# Altium schematic symbol library WR-TBL_Pluggable PCB Header.SchLib: 719 symbols (part 1 of 5)
Pins are listed as number, name and electrical type; pins without a type are passive.

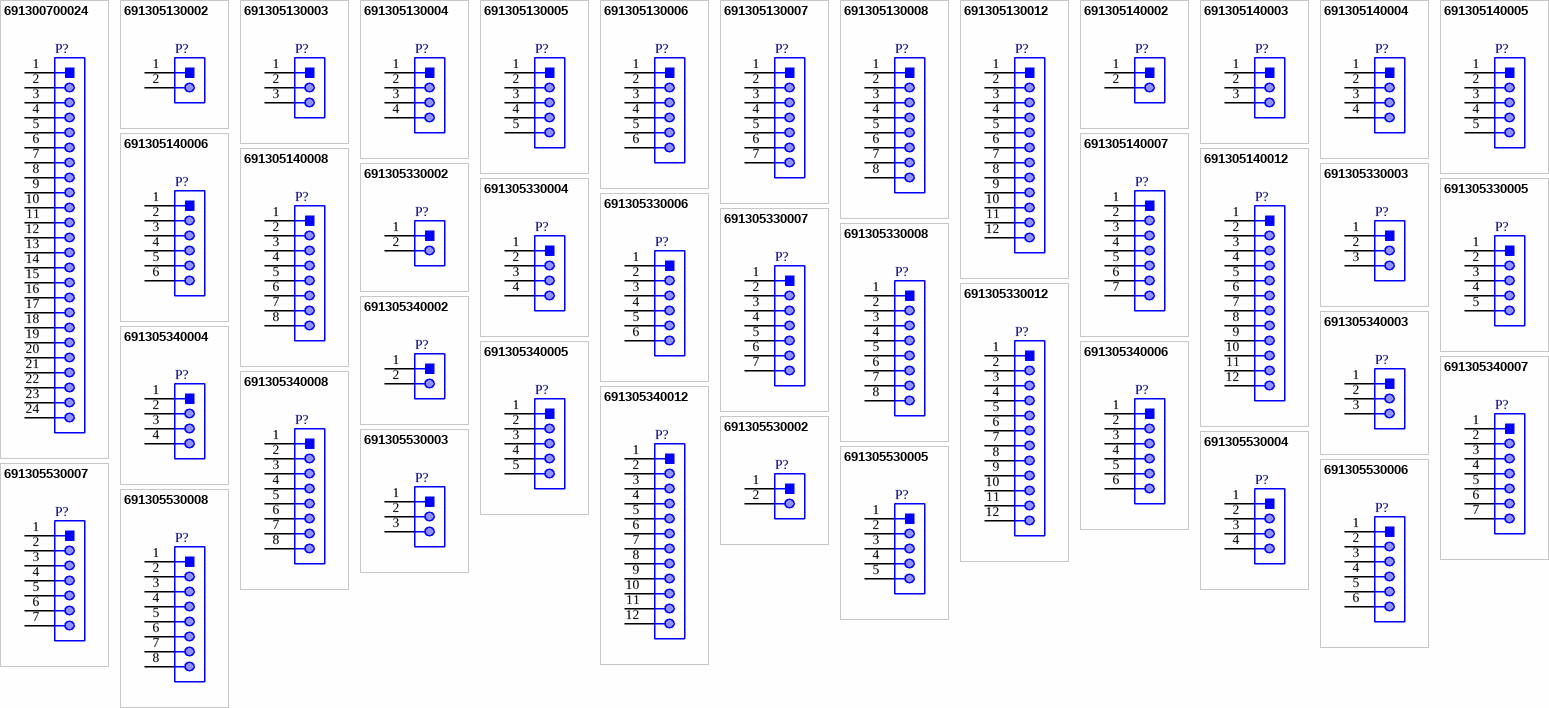
[diagram p0: symbols 691300700024 to 691305530008]

## 691300700024
designator P?
WR-TBL Serie 300 Vertical Pin Header, Pluggable, pitch 5mm, 24p; Part Number: 691300700024; Compliance: RoHS; Modularity: Yes; PCB/Cable/Panel: PCB; Pin Number: 24; Rated Current [UL]: 15A; Working Voltage [UL]: 300VAC; ComponentLink1Description: Manufacturer; ComponentLink1URL: http://www.we-online.de; ComponentLink2URL: https://katalog.we-online.de/em/datasheet/691300700024.pdf; ComponentLink2Description: Datasheet; Mounting Technology: THT; Packaging: Box; Operating Temperature: -40 to +105degC; Pitch: 5mm; Published Date: October 2019; Type: Vertical; Publisher: Wurth Elektronik; Application: Pluggable
footprint 691300700024
pins: 1, 2, 3, 4, 5, 6, 7, 8, 9, 10, 11, 12, 13, 14, 15, 16, 17, 18, 19, 20, 21, 22, 23, 24

## 691305130002
designator P?
WR-TBL Serie 3051 Vertical PCB Header, Pluggable, pitch 3.5mm, 2p; Part Number: 691305130002; Compliance: Lead free / RoHS; Modularity: No; Pin Number: 2; Rated Current [UL]: 12A; Working Voltage [UL]: 300VAC; ComponentLink1Description: Manufacturer; ComponentLink1URL: http://www.we-online.de; ComponentLink2URL: https://katalog.we-online.de/em/datasheet/691305130002.pdf; ComponentLink2Description: Datasheet; Mounting Technology: THT; Packaging: Box; Operating Temperature: -40 to +105degC; PCB/Cable/Panel: PCB; Pitch: 3.5mm; Published Date: October 2019; Type: Vertical; Publisher: Wurth Elektronik; Application: Pluggable
footprint 691305130002
pins: 1, 2

## 691305130003
designator P?
WR-TBL Serie 3051 Vertical PCB Header, Pluggable, pitch 3.5mm, 3p; Part Number: 691305130003; Compliance: Lead free / RoHS; Modularity: No; Pin Number: 3; Rated Current [UL]: 12A; Working Voltage [UL]: 300VAC; ComponentLink1Description: Manufacturer; ComponentLink1URL: http://www.we-online.de; ComponentLink2URL: https://katalog.we-online.de/em/datasheet/691305130003.pdf; ComponentLink2Description: Datasheet; Mounting Technology: THT; Packaging: Box; Operating Temperature: -40 to +105degC; PCB/Cable/Panel: PCB; Pitch: 3.5mm; Published Date: October 2019; Type: Vertical; Publisher: Wurth Elektronik; Application: Pluggable
footprint 691305130003
pins: 1, 2, 3

## 691305130004
designator P?
WR-TBL Serie 3051 Vertical PCB Header, Pluggable, pitch 3.5mm, 4p; Part Number: 691305130004; Compliance: Lead free / RoHS; Modularity: No; Pin Number: 4; Rated Current [UL]: 12A; Working Voltage [UL]: 300VAC; ComponentLink1Description: Manufacturer; ComponentLink1URL: http://www.we-online.de; ComponentLink2URL: https://katalog.we-online.de/em/datasheet/691305130004.pdf; ComponentLink2Description: Datasheet; Mounting Technology: THT; Packaging: Box; Operating Temperature: -40 to +105degC; PCB/Cable/Panel: PCB; Pitch: 3.5mm; Published Date: October 2019; Type: Vertical; Publisher: Wurth Elektronik; Application: Pluggable
footprint 691305130004
pins: 1, 2, 3, 4

## 691305130005
designator P?
WR-TBL Serie 3051 Vertical PCB Header, Pluggable, pitch 3.5mm, 5p; Part Number: 691305130005; Compliance: Lead free / RoHS; Modularity: No; Pin Number: 5; Rated Current [UL]: 12A; Working Voltage [UL]: 300VAC; ComponentLink1Description: Manufacturer; ComponentLink1URL: http://www.we-online.de; ComponentLink2URL: https://katalog.we-online.de/em/datasheet/691305130005.pdf; ComponentLink2Description: Datasheet; Mounting Technology: THT; Packaging: Box; Operating Temperature: -40 to +105degC; PCB/Cable/Panel: PCB; Pitch: 3.5mm; Published Date: October 2019; Type: Vertical; Publisher: Wurth Elektronik; Application: Pluggable
footprint 691305130005
pins: 1, 2, 3, 4, 5

## 691305130006
designator P?
WR-TBL Serie 3051 Vertical PCB Header, Pluggable, pitch 3.5mm, 6p; Part Number: 691305130006; Compliance: Lead free / RoHS; Modularity: No; Pin Number: 6; Rated Current [UL]: 12A; Working Voltage [UL]: 300VAC; ComponentLink1Description: Manufacturer; ComponentLink1URL: http://www.we-online.de; ComponentLink2URL: https://katalog.we-online.de/em/datasheet/691305130006.pdf; ComponentLink2Description: Datasheet; Mounting Technology: THT; Packaging: Box; Operating Temperature: -40 to +105degC; PCB/Cable/Panel: PCB; Pitch: 3.5mm; Published Date: October 2019; Type: Vertical; Publisher: Wurth Elektronik; Application: Pluggable
footprint 691305130006
pins: 1, 2, 3, 4, 5, 6

## 691305130007
designator P?
WR-TBL Serie 3051 Vertical PCB Header, Pluggable, pitch 3.5mm, 7p; Part Number: 691305130007; Compliance: Lead free / RoHS; Modularity: No; Pin Number: 7; Rated Current [UL]: 12A; Working Voltage [UL]: 300VAC; ComponentLink1Description: Manufacturer; ComponentLink1URL: http://www.we-online.de; ComponentLink2URL: https://katalog.we-online.de/em/datasheet/691305130007.pdf; ComponentLink2Description: Datasheet; Mounting Technology: THT; Packaging: Box; Operating Temperature: -40 to +105degC; PCB/Cable/Panel: PCB; Pitch: 3.5mm; Published Date: October 2019; Type: Vertical; Publisher: Wurth Elektronik; Application: Pluggable
footprint 691305130007
pins: 1, 2, 3, 4, 5, 6, 7

## 691305130008
designator P?
WR-TBL Serie 3051 Vertical PCB Header, Pluggable, pitch 3.5mm, 8p; Part Number: 691305130008; Compliance: Lead free / RoHS; Modularity: No; Pin Number: 8; Rated Current [UL]: 12A; Working Voltage [UL]: 300VAC; ComponentLink1Description: Manufacturer; ComponentLink1URL: http://www.we-online.de; ComponentLink2URL: https://katalog.we-online.de/em/datasheet/691305130008.pdf; ComponentLink2Description: Datasheet; Mounting Technology: THT; Packaging: Box; Operating Temperature: -40 to +105degC; PCB/Cable/Panel: PCB; Pitch: 3.5mm; Published Date: October 2019; Type: Vertical; Publisher: Wurth Elektronik; Application: Pluggable
footprint 691305130008
pins: 1, 2, 3, 4, 5, 6, 7, 8

## 691305130012
designator P?
WR-TBL Serie 3051 Vertical PCB Header, Pluggable, pitch 3.5mm, 12p; Part Number: 691305130012; Compliance: Lead free / RoHS; Modularity: No; Pin Number: 12; Rated Current [UL]: 12A; Working Voltage [UL]: 300VAC; ComponentLink1Description: Manufacturer; ComponentLink1URL: http://www.we-online.de; ComponentLink2URL: https://katalog.we-online.de/em/datasheet/691305130012.pdf; ComponentLink2Description: Datasheet; Mounting Technology: THT; Packaging: Box; Operating Temperature: -40 to +105degC; PCB/Cable/Panel: PCB; Pitch: 3.5mm; Published Date: October 2019; Type: Vertical; Publisher: Wurth Elektronik; Application: Pluggable
footprint 691305130012
pins: 1, 2, 3, 4, 5, 6, 7, 8, 9, 10, 11, 12

## 691305140002
designator P?
WR-TBL Serie 3051 Horizontal PCB Header, Pluggable, pitch 3.5mm, 2p; Part Number: 691305140002; Compliance: Lead free / RoHS; Modularity: No; Pin Number: 2; Rated Current [UL]: 12A; Working Voltage [UL]: 300VAC; ComponentLink1Description: Manufacturer; ComponentLink1URL: http://www.we-online.de; ComponentLink2URL: https://katalog.we-online.de/em/datasheet/691305140002.pdf; ComponentLink2Description: Datasheet; Mounting Technology: THT; Packaging: Box; Operating Temperature: -40 to +105degC; PCB/Cable/Panel: PCB; Pitch: 3.5mm; Published Date: October 2019; Type: Horizontal; Publisher: Wurth Elektronik; Application: Pluggable
footprint 691305140002
pins: 1, 2

## 691305140003
designator P?
WR-TBL Serie 3051 Horizontal PCB Header, Pluggable, pitch 3.5mm, 3p; Part Number: 691305140003; Compliance: Lead free / RoHS; Modularity: No; Pin Number: 3; Rated Current [UL]: 12A; Working Voltage [UL]: 300VAC; ComponentLink1Description: Manufacturer; ComponentLink1URL: http://www.we-online.de; ComponentLink2URL: https://katalog.we-online.de/em/datasheet/691305140003.pdf; ComponentLink2Description: Datasheet; Mounting Technology: THT; Packaging: Box; Operating Temperature: -40 to +105degC; PCB/Cable/Panel: PCB; Pitch: 3.5mm; Published Date: October 2019; Type: Horizontal; Publisher: Wurth Elektronik; Application: Pluggable
footprint 691305140003
pins: 1, 2, 3

## 691305140004
designator P?
WR-TBL Serie 3051 Horizontal PCB Header, Pluggable, pitch 3.5mm, 4p; Part Number: 691305140004; Compliance: Lead free / RoHS; Modularity: No; Pin Number: 4; Rated Current [UL]: 12A; Working Voltage [UL]: 300VAC; ComponentLink1Description: Manufacturer; ComponentLink1URL: http://www.we-online.de; ComponentLink2URL: https://katalog.we-online.de/em/datasheet/691305140004.pdf; ComponentLink2Description: Datasheet; Mounting Technology: THT; Packaging: Box; Operating Temperature: -40 to +105degC; PCB/Cable/Panel: PCB; Pitch: 3.5mm; Published Date: October 2019; Type: Horizontal; Publisher: Wurth Elektronik; Application: Pluggable
footprint 691305140004
pins: 1, 2, 3, 4

## 691305140005
designator P?
WR-TBL Serie 3051 Horizontal PCB Header, Pluggable, pitch 3.5mm, 5p; Part Number: 691305140005; Compliance: Lead free / RoHS; Modularity: No; Pin Number: 5; Rated Current [UL]: 12A; Working Voltage [UL]: 300VAC; ComponentLink1Description: Manufacturer; ComponentLink1URL: http://www.we-online.de; ComponentLink2URL: https://katalog.we-online.de/em/datasheet/691305140005.pdf; ComponentLink2Description: Datasheet; Mounting Technology: THT; Packaging: Box; Operating Temperature: -40 to +105degC; PCB/Cable/Panel: PCB; Pitch: 3.5mm; Published Date: October 2019; Type: Horizontal; Publisher: Wurth Elektronik; Application: Pluggable
footprint 691305140005
pins: 1, 2, 3, 4, 5

## 691305140006
designator P?
WR-TBL Serie 3051 Horizontal PCB Header, Pluggable, pitch 3.5mm, 6p; Part Number: 691305140006; Compliance: Lead free / RoHS; Modularity: No; Pin Number: 6; Rated Current [UL]: 12A; Working Voltage [UL]: 300VAC; ComponentLink1Description: Manufacturer; ComponentLink1URL: http://www.we-online.de; ComponentLink2URL: https://katalog.we-online.de/em/datasheet/691305140006.pdf; ComponentLink2Description: Datasheet; Mounting Technology: THT; Packaging: Box; Operating Temperature: -40 to +105degC; PCB/Cable/Panel: PCB; Pitch: 3.5mm; Published Date: October 2019; Type: Horizontal; Publisher: Wurth Elektronik; Application: Pluggable
footprint 691305140006
pins: 1, 2, 3, 4, 5, 6

## 691305140007
designator P?
WR-TBL Serie 3051 Horizontal PCB Header, Pluggable, pitch 3.5mm, 7p; Part Number: 691305140007; Compliance: Lead free / RoHS; Modularity: No; Pin Number: 7; Rated Current [UL]: 12A; Working Voltage [UL]: 300VAC; ComponentLink1Description: Manufacturer; ComponentLink1URL: http://www.we-online.de; ComponentLink2URL: https://katalog.we-online.de/em/datasheet/691305140007.pdf; ComponentLink2Description: Datasheet; Mounting Technology: THT; Packaging: Box; Operating Temperature: -40 to +105degC; PCB/Cable/Panel: PCB; Pitch: 3.5mm; Published Date: October 2019; Type: Horizontal; Publisher: Wurth Elektronik; Application: Pluggable
footprint 691305140007
pins: 1, 2, 3, 4, 5, 6, 7

## 691305140008
designator P?
WR-TBL Serie 3051 Horizontal PCB Header, Pluggable, pitch 3.5mm, 8p; Part Number: 691305140008; Compliance: Lead free / RoHS; Modularity: No; Pin Number: 8; Rated Current [UL]: 12A; Working Voltage [UL]: 300VAC; ComponentLink1Description: Manufacturer; ComponentLink1URL: http://www.we-online.de; ComponentLink2URL: https://katalog.we-online.de/em/datasheet/691305140008.pdf; ComponentLink2Description: Datasheet; Mounting Technology: THT; Packaging: Box; Operating Temperature: -40 to +105degC; PCB/Cable/Panel: PCB; Pitch: 3.5mm; Published Date: October 2019; Type: Horizontal; Publisher: Wurth Elektronik; Application: Pluggable
footprint 691305140008
pins: 1, 2, 3, 4, 5, 6, 7, 8

## 691305140012
designator P?
WR-TBL Serie 3051 Horizontal PCB Header, Pluggable, pitch 3.5mm, 12p; Part Number: 691305140012; Compliance: Lead free / RoHS; Modularity: No; Pin Number: 12; Rated Current [UL]: 12A; Working Voltage [UL]: 300VAC; ComponentLink1Description: Manufacturer; ComponentLink1URL: http://www.we-online.de; ComponentLink2URL: https://katalog.we-online.de/em/datasheet/691305140012.pdf; ComponentLink2Description: Datasheet; Mounting Technology: THT; Packaging: Box; Operating Temperature: -40 to +105degC; PCB/Cable/Panel: PCB; Pitch: 3.5mm; Published Date: October 2019; Type: Horizontal; Publisher: Wurth Elektronik; Application: Pluggable
footprint 691305140012
pins: 1, 2, 3, 4, 5, 6, 7, 8, 9, 10, 11, 12

## 691305330002
designator P?
WR-TBL Serie 3053 Vertical PCB Header, Pluggable, pitch 3.81mm, 2p; Part Number: 691305330002; Compliance: Lead free / RoHS; Modularity: No; Pin Number: 2; Rated Current [UL]: 12A; Working Voltage [UL]: 300VAC; ComponentLink1Description: Manufacturer; ComponentLink1URL: http://www.we-online.de; ComponentLink2URL: https://katalog.we-online.de/em/datasheet/691305330002.pdf; ComponentLink2Description: Datasheet; Mounting Technology: THT; Packaging: Box; Operating Temperature: -40 to +105degC; PCB/Cable/Panel: PCB; Pitch: 3.81mm; Published Date: October 2019; Type: Vertical; Publisher: Wurth Elektronik; Application: Pluggable
footprint 691305330002
pins: 1, 2

## 691305330003
designator P?
WR-TBL Serie 3053 Vertical PCB Header, Pluggable, pitch 3.81mm, 3p; Part Number: 691305330003; Compliance: Lead free / RoHS; Modularity: No; Pin Number: 3; Rated Current [UL]: 12A; Working Voltage [UL]: 300VAC; ComponentLink1Description: Manufacturer; ComponentLink1URL: http://www.we-online.de; ComponentLink2URL: https://katalog.we-online.de/em/datasheet/691305330003.pdf; ComponentLink2Description: Datasheet; Mounting Technology: THT; Packaging: Box; Operating Temperature: -40 to +105degC; PCB/Cable/Panel: PCB; Pitch: 3.81mm; Published Date: October 2019; Type: Vertical; Publisher: Wurth Elektronik; Application: Pluggable
footprint 691305330003
pins: 1, 2, 3

## 691305330004
designator P?
WR-TBL Serie 3053 Vertical PCB Header, Pluggable, pitch 3.81mm, 4p; Part Number: 691305330004; Compliance: Lead free / RoHS; Modularity: No; Pin Number: 4; Rated Current [UL]: 12A; Working Voltage [UL]: 300VAC; ComponentLink1Description: Manufacturer; ComponentLink1URL: http://www.we-online.de; ComponentLink2URL: https://katalog.we-online.de/em/datasheet/691305330004.pdf; ComponentLink2Description: Datasheet; Mounting Technology: THT; Packaging: Box; Operating Temperature: -40 to +105degC; PCB/Cable/Panel: PCB; Pitch: 3.81mm; Published Date: October 2019; Type: Vertical; Publisher: Wurth Elektronik; Application: Pluggable
footprint 691305330004
pins: 1, 2, 3, 4

## 691305330005
designator P?
WR-TBL Serie 3053 Vertical PCB Header, Pluggable, pitch 3.81mm, 5p; Part Number: 691305330005; Compliance: Lead free / RoHS; Modularity: No; Pin Number: 5; Rated Current [UL]: 12A; Working Voltage [UL]: 300VAC; ComponentLink1Description: Manufacturer; ComponentLink1URL: http://www.we-online.de; ComponentLink2URL: https://katalog.we-online.de/em/datasheet/691305330005.pdf; ComponentLink2Description: Datasheet; Mounting Technology: THT; Packaging: Box; Operating Temperature: -40 to +105degC; PCB/Cable/Panel: PCB; Pitch: 3.81mm; Published Date: October 2019; Type: Vertical; Publisher: Wurth Elektronik; Application: Pluggable
footprint 691305330005
pins: 1, 2, 3, 4, 5

## 691305330006
designator P?
WR-TBL Serie 3053 Vertical PCB Header, Pluggable, pitch 3.81mm, 6p; Part Number: 691305330006; Compliance: Lead free / RoHS; Modularity: No; Pin Number: 6; Rated Current [UL]: 12A; Working Voltage [UL]: 300VAC; ComponentLink1Description: Manufacturer; ComponentLink1URL: http://www.we-online.de; ComponentLink2URL: https://katalog.we-online.de/em/datasheet/691305330006.pdf; ComponentLink2Description: Datasheet; Mounting Technology: THT; Packaging: Box; Operating Temperature: -40 to +105degC; PCB/Cable/Panel: PCB; Pitch: 3.81mm; Published Date: October 2019; Type: Vertical; Publisher: Wurth Elektronik; Application: Pluggable
footprint 691305330006
pins: 1, 2, 3, 4, 5, 6

## 691305330007
designator P?
WR-TBL Serie 3053 Vertical PCB Header, Pluggable, pitch 3.81mm, 7p; Part Number: 691305330007; Compliance: Lead free / RoHS; Modularity: No; Pin Number: 7; Rated Current [UL]: 12A; Working Voltage [UL]: 300VAC; ComponentLink1Description: Manufacturer; ComponentLink1URL: http://www.we-online.de; ComponentLink2URL: https://katalog.we-online.de/em/datasheet/691305330007.pdf; ComponentLink2Description: Datasheet; Mounting Technology: THT; Packaging: Box; Operating Temperature: -40 to +105degC; PCB/Cable/Panel: PCB; Pitch: 3.81mm; Published Date: October 2019; Type: Vertical; Publisher: Wurth Elektronik; Application: Pluggable
footprint 691305330007
pins: 1, 2, 3, 4, 5, 6, 7

## 691305330008
designator P?
WR-TBL Serie 3053 Vertical PCB Header, Pluggable, pitch 3.81mm, 8p; Part Number: 691305330008; Compliance: Lead free / RoHS; Modularity: No; Pin Number: 8; Rated Current [UL]: 12A; Working Voltage [UL]: 300VAC; ComponentLink1Description: Manufacturer; ComponentLink1URL: http://www.we-online.de; ComponentLink2URL: https://katalog.we-online.de/em/datasheet/691305330008.pdf; ComponentLink2Description: Datasheet; Mounting Technology: THT; Packaging: Box; Operating Temperature: -40 to +105degC; PCB/Cable/Panel: PCB; Pitch: 3.81mm; Published Date: October 2019; Type: Vertical; Publisher: Wurth Elektronik; Application: Pluggable
footprint 691305330008
pins: 1, 2, 3, 4, 5, 6, 7, 8

## 691305330012
designator P?
WR-TBL Serie 3053 Vertical PCB Header, Pluggable, pitch 3.81mm, 12p; Part Number: 691305330012; Compliance: Lead free / RoHS; Modularity: No; Pin Number: 12; Rated Current [UL]: 12A; Working Voltage [UL]: 300VAC; ComponentLink1Description: Manufacturer; ComponentLink1URL: http://www.we-online.de; ComponentLink2URL: https://katalog.we-online.de/em/datasheet/691305330012.pdf; ComponentLink2Description: Datasheet; Mounting Technology: THT; Packaging: Box; Operating Temperature: -40 to +105degC; PCB/Cable/Panel: PCB; Pitch: 3.81mm; Published Date: October 2019; Type: Vertical; Publisher: Wurth Elektronik; Application: Pluggable
footprint 691305330012
pins: 1, 2, 3, 4, 5, 6, 7, 8, 9, 10, 11, 12

## 691305340002
designator P?
WR-TBL Serie 3053 Horizontal PCB Header, Pluggable, pitch 3.81mm, 2p; Part Number: 691305340002; Compliance: Lead free / RoHS; Modularity: No; Pin Number: 2; Rated Current [UL]: 12A; Working Voltage [UL]: 300VAC; ComponentLink1Description: Manufacturer; ComponentLink1URL: http://www.we-online.de; ComponentLink2URL: https://katalog.we-online.de/em/datasheet/691305340002.pdf; ComponentLink2Description: Datasheet; Mounting Technology: THT; Packaging: Box; Operating Temperature: -40 to +105degC; PCB/Cable/Panel: PCB; Pitch: 3.81mm; Published Date: October 2019; Type: Horizontal; Publisher: Wurth Elektronik; Application: Pluggable
footprint 691305340002
pins: 1, 2

## 691305340003
designator P?
WR-TBL Serie 3053 Horizontal PCB Header, Pluggable, pitch 3.81mm, 3p; Part Number: 691305340003; Compliance: Lead free / RoHS; Modularity: No; Pin Number: 3; Rated Current [UL]: 12A; Working Voltage [UL]: 300VAC; ComponentLink1Description: Manufacturer; ComponentLink1URL: http://www.we-online.de; ComponentLink2URL: https://katalog.we-online.de/em/datasheet/691305340003.pdf; ComponentLink2Description: Datasheet; Mounting Technology: THT; Packaging: Box; Operating Temperature: -40 to +105degC; PCB/Cable/Panel: PCB; Pitch: 3.81mm; Published Date: October 2019; Type: Horizontal; Publisher: Wurth Elektronik; Application: Pluggable
footprint 691305340003
pins: 1, 2, 3

## 691305340004
designator P?
WR-TBL Serie 3053 Horizontal PCB Header, Pluggable, pitch 3.81mm, 4p; Part Number: 691305340004; Compliance: Lead free / RoHS; Modularity: No; Pin Number: 4; Rated Current [UL]: 12A; Working Voltage [UL]: 300VAC; ComponentLink1Description: Manufacturer; ComponentLink1URL: http://www.we-online.de; ComponentLink2URL: https://katalog.we-online.de/em/datasheet/691305340004.pdf; ComponentLink2Description: Datasheet; Mounting Technology: THT; Packaging: Box; Operating Temperature: -40 to +105degC; PCB/Cable/Panel: PCB; Pitch: 3.81mm; Published Date: October 2019; Type: Horizontal; Publisher: Wurth Elektronik; Application: Pluggable
footprint 691305340004
pins: 1, 2, 3, 4

## 691305340005
designator P?
WR-TBL Serie 3053 Horizontal PCB Header, Pluggable, pitch 3.81mm, 5p; Part Number: 691305340005; Compliance: Lead free / RoHS; Modularity: No; Pin Number: 5; Rated Current [UL]: 12A; Working Voltage [UL]: 300VAC; ComponentLink1Description: Manufacturer; ComponentLink1URL: http://www.we-online.de; ComponentLink2URL: https://katalog.we-online.de/em/datasheet/691305340005.pdf; ComponentLink2Description: Datasheet; Mounting Technology: THT; Packaging: Box; Operating Temperature: -40 to +105degC; PCB/Cable/Panel: PCB; Pitch: 3.81mm; Published Date: October 2019; Type: Horizontal; Publisher: Wurth Elektronik; Application: Pluggable
footprint 691305340005
pins: 1, 2, 3, 4, 5

## 691305340006
designator P?
WR-TBL Serie 3053 Horizontal PCB Header, Pluggable, pitch 3.81mm, 6p; Part Number: 691305340006; Compliance: Lead free / RoHS; Modularity: No; Pin Number: 6; Rated Current [UL]: 12A; Working Voltage [UL]: 300VAC; ComponentLink1Description: Manufacturer; ComponentLink1URL: http://www.we-online.de; ComponentLink2URL: https://katalog.we-online.de/em/datasheet/691305340006.pdf; ComponentLink2Description: Datasheet; Mounting Technology: THT; Packaging: Box; Operating Temperature: -40 to +105degC; PCB/Cable/Panel: PCB; Pitch: 3.81mm; Published Date: October 2019; Type: Horizontal; Publisher: Wurth Elektronik; Application: Pluggable
footprint 691305340006
pins: 1, 2, 3, 4, 5, 6

## 691305340007
designator P?
WR-TBL Serie 3053 Horizontal PCB Header, Pluggable, pitch 3.81mm, 7p; Part Number: 691305340007; Compliance: Lead free / RoHS; Modularity: No; Pin Number: 7; Rated Current [UL]: 12A; Working Voltage [UL]: 300VAC; ComponentLink1Description: Manufacturer; ComponentLink1URL: http://www.we-online.de; ComponentLink2URL: https://katalog.we-online.de/em/datasheet/691305340007.pdf; ComponentLink2Description: Datasheet; Mounting Technology: THT; Packaging: Box; Operating Temperature: -40 to +105degC; PCB/Cable/Panel: PCB; Pitch: 3.81mm; Published Date: October 2019; Type: Horizontal; Publisher: Wurth Elektronik; Application: Pluggable
footprint 691305340007
pins: 1, 2, 3, 4, 5, 6, 7

## 691305340008
designator P?
WR-TBL Serie 3053 Horizontal PCB Header, Pluggable, pitch 3.81mm, 8p; Part Number: 691305340008; Compliance: Lead free / RoHS; Modularity: No; Pin Number: 8; Rated Current [UL]: 12A; Working Voltage [UL]: 300VAC; ComponentLink1Description: Manufacturer; ComponentLink1URL: http://www.we-online.de; ComponentLink2URL: https://katalog.we-online.de/em/datasheet/691305340008.pdf; ComponentLink2Description: Datasheet; Mounting Technology: THT; Packaging: Box; Operating Temperature: -40 to +105degC; PCB/Cable/Panel: PCB; Pitch: 3.81mm; Published Date: October 2019; Type: Horizontal; Publisher: Wurth Elektronik; Application: Pluggable
footprint 691305340008
pins: 1, 2, 3, 4, 5, 6, 7, 8

## 691305340012
designator P?
WR-TBL Serie 3053 Horizontal PCB Header, Pluggable, pitch 3.81mm, 12p; Part Number: 691305340012; Compliance: Lead free / RoHS; Modularity: No; Pin Number: 12; Rated Current [UL]: 12A; Working Voltage [UL]: 300VAC; ComponentLink1Description: Manufacturer; ComponentLink1URL: http://www.we-online.de; ComponentLink2URL: https://katalog.we-online.de/em/datasheet/691305340012.pdf; ComponentLink2Description: Datasheet; Mounting Technology: THT; Packaging: Box; Operating Temperature: -40 to +105degC; PCB/Cable/Panel: PCB; Pitch: 3.81mm; Published Date: October 2019; Type: Horizontal; Publisher: Wurth Elektronik; Application: Pluggable
footprint 691305340012
pins: 1, 2, 3, 4, 5, 6, 7, 8, 9, 10, 11, 12

## 691305530002
designator P?
WR-TBL Serie 3055 PCB Header Vertical Entry with Plastic Latches, Pluggable, pitch 5.08mm, 2p; Part Number: 691305530002; Compliance: RoHS; Modularity: No; Pin Number: 2; Rated Current [UL]: 16A; Working Voltage [UL]: 300VAC; ComponentLink1Description: Manufacturer; ComponentLink1URL: http://www.we-online.de; ComponentLink2URL: https://katalog.we-online.de/em/datasheet/691305530002.pdf; ComponentLink2Description: Datasheet; Mounting Technology: THT; Packaging: Box; Operating Temperature: -40 to +105degC; PCB/Cable/Panel: PCB; Pitch: 5.08mm; Published Date: October 2019; Type: Vertical; Publisher: Wurth Elektronik; Application: Pluggable
footprint 691305530002
pins: 1, 2

## 691305530003
designator P?
WR-TBL Serie 3055 PCB Header Vertical Entry with Plastic Latches, Pluggable, pitch 5.08mm, 3p; Part Number: 691305530003; Compliance: RoHS; Modularity: No; Pin Number: 3; Rated Current [UL]: 16A; Working Voltage [UL]: 300VAC; ComponentLink1Description: Manufacturer; ComponentLink1URL: http://www.we-online.de; ComponentLink2URL: https://katalog.we-online.de/em/datasheet/691305530003.pdf; ComponentLink2Description: Datasheet; Mounting Technology: THT; Packaging: Box; Operating Temperature: -40 to +105degC; PCB/Cable/Panel: PCB; Pitch: 5.08mm; Published Date: October 2019; Type: Vertical; Publisher: Wurth Elektronik; Application: Pluggable
footprint 691305530003
pins: 1, 2, 3

## 691305530004
designator P?
WR-TBL Serie 3055 PCB Header Vertical Entry with Plastic Latches, Pluggable, pitch 5.08mm, 4p; Part Number: 691305530004; Compliance: RoHS; Modularity: No; Pin Number: 4; Rated Current [UL]: 16A; Working Voltage [UL]: 300VAC; ComponentLink1Description: Manufacturer; ComponentLink1URL: http://www.we-online.de; ComponentLink2URL: https://katalog.we-online.de/em/datasheet/691305530004.pdf; ComponentLink2Description: Datasheet; Mounting Technology: THT; Packaging: Box; Operating Temperature: -40 to +105degC; PCB/Cable/Panel: PCB; Pitch: 5.08mm; Published Date: October 2019; Type: Vertical; Publisher: Wurth Elektronik; Application: Pluggable
footprint 691305530004
pins: 1, 2, 3, 4

## 691305530005
designator P?
WR-TBL Serie 3055 PCB Header Vertical Entry with Plastic Latches, Pluggable, pitch 5.08mm, 5p; Part Number: 691305530005; Compliance: RoHS; Modularity: No; Pin Number: 5; Rated Current [UL]: 16A; Working Voltage [UL]: 300VAC; ComponentLink1Description: Manufacturer; ComponentLink1URL: http://www.we-online.de; ComponentLink2URL: https://katalog.we-online.de/em/datasheet/691305530005.pdf; ComponentLink2Description: Datasheet; Mounting Technology: THT; Packaging: Box; Operating Temperature: -40 to +105degC; PCB/Cable/Panel: PCB; Pitch: 5.08mm; Published Date: October 2019; Type: Vertical; Publisher: Wurth Elektronik; Application: Pluggable
footprint 691305530005
pins: 1, 2, 3, 4, 5

## 691305530006
designator P?
WR-TBL Serie 3055 PCB Header Vertical Entry with Plastic Latches, Pluggable, pitch 5.08mm, 6p; Part Number: 691305530006; Compliance: RoHS; Modularity: No; Pin Number: 6; Rated Current [UL]: 16A; Working Voltage [UL]: 300VAC; ComponentLink1Description: Manufacturer; ComponentLink1URL: http://www.we-online.de; ComponentLink2URL: https://katalog.we-online.de/em/datasheet/691305530006.pdf; ComponentLink2Description: Datasheet; Mounting Technology: THT; Packaging: Box; Operating Temperature: -40 to +105degC; PCB/Cable/Panel: PCB; Pitch: 5.08mm; Published Date: October 2019; Type: Vertical; Publisher: Wurth Elektronik; Application: Pluggable
footprint 691305530006
pins: 1, 2, 3, 4, 5, 6

## 691305530007
designator P?
WR-TBL Serie 3055 PCB Header Vertical Entry with Plastic Latches, Pluggable, pitch 5.08mm, 7p; Part Number: 691305530007; Compliance: RoHS; Modularity: No; Pin Number: 7; Rated Current [UL]: 16A; Working Voltage [UL]: 300VAC; ComponentLink1Description: Manufacturer; ComponentLink1URL: http://www.we-online.de; ComponentLink2URL: https://katalog.we-online.de/em/datasheet/691305530007.pdf; ComponentLink2Description: Datasheet; Mounting Technology: THT; Packaging: Box; Operating Temperature: -40 to +105degC; PCB/Cable/Panel: PCB; Pitch: 5.08mm; Published Date: October 2019; Type: Vertical; Publisher: Wurth Elektronik; Application: Pluggable
footprint 691305530007
pins: 1, 2, 3, 4, 5, 6, 7

## 691305530008
designator P?
WR-TBL Serie 3055 PCB Header Vertical Entry with Plastic Latches, Pluggable, pitch 5.08mm, 8p; Part Number: 691305530008; Compliance: RoHS; Modularity: No; Pin Number: 8; Rated Current [UL]: 16A; Working Voltage [UL]: 300VAC; ComponentLink1Description: Manufacturer; ComponentLink1URL: http://www.we-online.de; ComponentLink2URL: https://katalog.we-online.de/em/datasheet/691305530008.pdf; ComponentLink2Description: Datasheet; Mounting Technology: THT; Packaging: Box; Operating Temperature: -40 to +105degC; PCB/Cable/Panel: PCB; Pitch: 5.08mm; Published Date: October 2019; Type: Vertical; Publisher: Wurth Elektronik; Application: Pluggable
footprint 691305530008
pins: 1, 2, 3, 4, 5, 6, 7, 8
